# Altium footprint library AI.PcbLib: 137 footprints (part 7 of 9)
Each footprint in its own frame and in the unit in brackets; x right, y up, seen from the top. Pads: shape width x height; smd on the part's side, far side on the other; paste and mask are expansions set on the pad; w line width, h text height; cw(c..) or ccw(c..) is an arc to the next point about the centre after c.
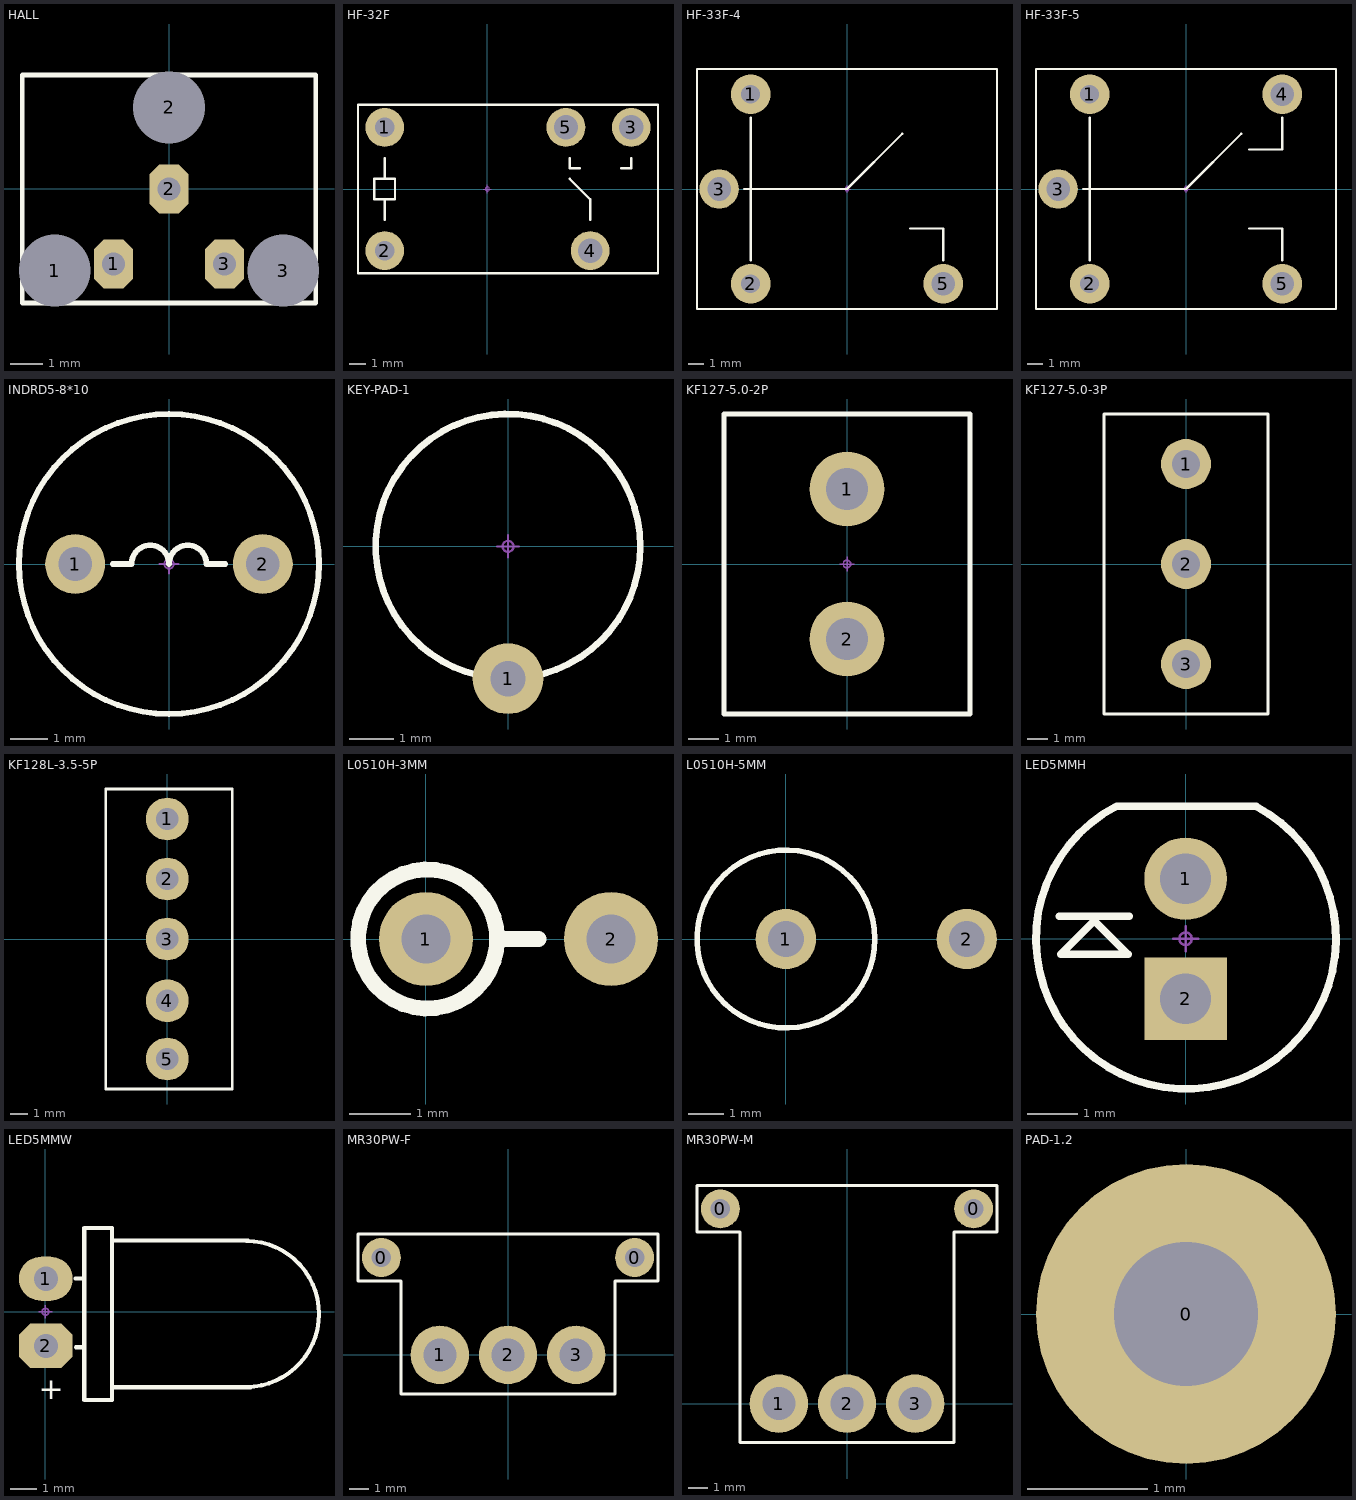
[diagram p6: the footprints below, top view; thin cyan lines are the x and y axes]

## HALL [mm]
pads (6):
  round 2 hole 2.2: 1(-3.5,-2.5) 2(0,2.5) 3(3.5,-2.5)
  oct 1.2x1.5 hole 0.7: 1(-1.7,-2.3) 2(0,0) 3(1.7,-2.3)
Top Overlay:
  lines w0.152: -4.5,-3.5 -4.5,3.5 4.5,3.5 4.5,-3.5 -4.5,-3.5
3D body "huoerjia.stp": height 13, standoff -2.5, extent -4.5,-3.5 4.5,3.5

## HF-32F [mm]
pads (5):
  round 2.4 hole 1.2: 1(-6.35,3.81) 2(-6.35,-3.81)
  round 2.4 hole 1.5: 3(8.89,3.81) 4(6.35,-3.81) 5(4.851,3.81)
Top Overlay:
  lines w0.152: -6.35,-1.905 -6.35,-0.635 ; -6.35,1.905 -6.35,0.635 ; 5.08,0.635 6.35,-0.635 6.35,-1.905 ; 5.08,1.905 5.08,1.27 5.715,1.27 ; 8.255,1.27 8.89,1.27 8.89,1.905 ; -6.35,0.635 -5.715,0.635 -5.715,-0.635 -6.985,-0.635 -6.985,0.635 -6.35,0.635 ; -8.001,-5.207 10.541,-5.207 10.541,5.207 -8.001,5.207 -8.001,-5.207
Mechanical 15:
  circle w0.05: c0,0 r0.125
  lines w0.05: -0.25,0 0.25,0 ; 0,-0.25 0,0.25
3D body "JZC-32F - 副本.stp": height 15.4, standoff -4.4, extent -7.85,-5 10.45,5

## HF-33F-4 [mm]
pads (4):
  round 2.5 hole 1.2: 1(-6.1,6) 2(-6.1,-6)
  round 2.5 hole 1.5: 3(-8.1,0) 5(6.1,-6)
Top Overlay:
  lines w0.152: -6.5,0 0,0 3.5,3.5 ; -6.1,-4.5 -6.1,4.5 ; 4,-2.5 6.1,-2.5 6.1,-4.5 ; -9.5,-7.6 9.5,-7.6 9.5,7.6 -9.5,7.6 -9.5,-7.6
Mechanical 15:
  circle w0.05: c0,0 r0.125
  lines w0.05: -0.25,0 0.25,0 ; 0,-0.25 0,0.25
3D body "User Library-SONGLE Relay SRU-12VDC-SL-C.STEP": height 15.3, standoff -5, extent -9.5,-7.75 9.6,7.75

## HF-33F-5 [mm]
pads (5):
  round 2.5 hole 1.2: 1(-6.1,6) 2(-6.1,-6)
  round 2.5 hole 1.5: 3(-8.1,0) 4(6.1,6) 5(6.1,-6)
Top Overlay:
  lines w0.152: -6.5,0 0,0 3.5,3.5 ; -6.1,-4.5 -6.1,4.5 ; 4,-2.5 6.1,-2.5 6.1,-4.5 ; 4,2.5 6.1,2.5 6.1,4.5 ; -9.5,-7.6 -9.5,7.6 9.5,7.6 9.5,-7.6 -9.5,-7.6
Mechanical 15:
  circle w0.05: c0,0 r0.125
  lines w0.05: -0.25,0 0.25,0 ; 0,-0.25 0,0.25
3D body "User Library-SONGLE Relay SRU-12VDC-SL-C.STEP": height 15.3, standoff -5, extent -9.5,-7.75 9.6,7.75

## INDRD5-8*10 [mm]
pads (2):
  round 1.6 hole 0.9: 1(-2.5,0) 2(2.5,0)
Top Overlay:
  circle w0.152: c0,0 r4
  lines w0.152: -1.5,0 -1,0 cw(c-0.5,0) 0,0 cw(c0.5,0) 1,0 1.5,0
Mechanical 15:
  circle w0.05: c0,0 r0.125
  lines w0.05: -0.25,0 0.25,0 ; 0,-0.25 0,0.25
3D body "Inductor.step": height 11.2, standoff -5, extent -4.15,-4.15 4.15,4.15

## KEY-PAD-1 [mm]
pads (1):
  round 1.6 hole 0.8: 1(0,-3)
Top Overlay:
  circle w0.152: c0,0 r3
Mechanical 15:
  circle w0.05: c0,0 r0.125
  lines w0.05: -0.25,0 0.25,0 ; 0,-0.25 0,0.25
3D body "02.stp": height 11.2, standoff -0.2, extent -5.184,-4.762 4.925,5.066

## KF127-5.0-2P [mm] "ONSHORE"
height 13
pads (2):
  round 2.5 hole 1.4: 1(0,2.5) 2(0,-2.5)
Top Overlay:
  lines w0.152: -4.1,-5 4.1,-5 4.1,5 -4.1,5 -4.1,-5
Mechanical 15:
  circle w0.05: c0,0 r0.125
  lines w0.05: -0.25,0 0.25,0 ; 0,-0.25 0,0.25

## KF127-5.0-3P [mm] "ONSHORE"
height 13
pads (3):
  round 2.5 hole 1.4: 1(0,5) 2(0,0) 3(0,-5)
Top Overlay:
  lines w0.152: -4.1,-7.5 4.1,-7.5 4.1,7.5 -4.1,7.5 -4.1,-7.5
Mechanical 15:
  circle w0.05: c0,0 r0.125
  lines w0.05: -0.25,0 0.25,0 ; 0,-0.25 0,0.25

## KF128L-3.5-5P [mm] "ONSHORE"
height 13
pads (5):
  round 2.5 hole 1.3: 1(0,7) 2(0,3.5) 3(0,0) 4(0,-3.6) 5(0,-7)
Top Overlay:
  lines w0.152: -3.6,-8.75 3.8,-8.75 3.8,8.75 -3.6,8.75 -3.6,-8.75
Mechanical 15:
  circle w0.05: c0,0 r0.125
  lines w0.05: -0.25,0 0.25,0 ; 0,-0.25 0,0.25

## L0510H-3MM [mil]
pads (2):
  round 60 hole 31.5: 1(0,0) 2(118.11,0)
Top Overlay:
  circle w10: c0.98,0 r44.39
  lines w10: 45.37,0 71.85,0
Mechanical 15:
  circle w1.97: c0,0 r4.92
  lines w1.97: -9.84,0 9.84,0 ; 0,-9.84 0,9.84
3D body "v150-080.stp": height 0.79, standoff -64.96, extent -29.52,-29.52 29.53,29.53
3D body "v150-080.stp": height 0.79, standoff -64.96, extent 88.59,-29.52 147.65,29.53
3D body "pr01h.stp": height 407.96, standoff -102.26, extent -31.4,-47.24 141.64,51.18

## L0510H-5MM [mm]
pads (2):
  round 1.7 hole 1: 1(0,0) 2(5.08,0)
Top Overlay:
  circle w0.152: c0,0 r2.5
Mechanical 15:
  circle w0.05: c0,0 r0.125
  circle w0.05: c0,0 r0.125
  lines w0.05: -0.25,0 0.25,0 -0.25,0 ; 0,-0.25 0,0.25 0,-0.25
3D body "RESADV508-1670X520.stp": height 23.6, standoff -3.7, extent -2.6,-2.6 5.47,2.6
3D body "v200-130.stp": height 0.02, standoff -1.65, extent -1,-1 1,1
3D body "v200-130.stp": height 0.02, standoff -1.65, extent 4.08,-1 6.08,1

## LED5MMH [mm]
pads (2):
  oval 1.65x1.651 hole 1.016 mask+0.03: 1(0,1.2)
  rect 1.65x1.651 hole 1.016 mask+0.03: 2(0,-1.2)
Top Overlay:
  lines w0.152: -2.525,0.451 -1.128,0.451 ; -1.4,2.644 ccw(c0.009,-0.005) 1.411,2.647 -1.378,2.647 ; -1.154,-0.311 -1.827,0.362 -2.5,-0.311 -1.15,-0.311
Mechanical 15:
  circle w0.05: c0,0 r0.125
  circle w0.05: c0,0 r0.125
  lines w0.05: -0.25,0 0.25,0 -0.25,0 ; 0,-0.25 0,0.25 0,-0.25
3D body "LED5_RED.STEP": height 8.6, standoff -2, extent -2.845,-2.891 2.852,2.459

## LED5MMW [mm]
pads (2):
  oval 2x1.651 hole 0.9 mask+0.03: 1(0.014,1.23)
  oct 2x1.651 hole 0.9 mask+0.03: 2(0.014,-1.271)
Top Overlay:
  lines w0.152: 1.115,1.245 1.445,1.245 ; 1.141,-1.321 1.395,-1.321 ; 2.487,-2.813 7.643,-2.813 ; 2.563,2.648 7.541,2.648 ; 7.491,2.642 cw(c7.469,-0.08) 7.491,-2.802 ; 1.445,-3.283 2.487,-3.283 2.487,3.117 1.445,3.117 1.445,-3.283
  text "+" at -0.256,-3.251 h0.81
Mechanical 15:
  circle w0.05: c0,0 r0.125
  circle w0.05: c0,0 r0.125
  lines w0.05: -0.25,0 0.25,0 -0.25,0 ; 0,-0.25 0,0.25 0,-0.25
3D body "LED5-H.STEP": height 6, standoff -2.07, extent -0.349,-3.073 11.174,2.927

## MR30PW-F [mm]
pads (5):
  round 2 hole 1: 0(-6.5,5) 0(6.5,5)
  round 3 hole 1.7: 1(-3.5,0) 2(0,0) 3(3.5,0)
Top Overlay:
  lines w0.152: -7.7,3.8 -7.7,6.2 7.7,6.2 7.7,3.8 5.5,3.8 5.5,-2 -5.5,-2 -5.5,3.8 -7.7,3.8

## MR30PW-M [mm]
pads (5):
  round 2 hole 1: 0(-6.5,10) 0(6.5,10)
  round 3 hole 1.7: 1(-3.5,0) 2(0,0) 3(3.5,0)
Top Overlay:
  lines w0.152: -7.7,8.8 -7.7,11.2 7.7,11.2 7.7,8.8 5.5,8.8 5.5,-2 -5.5,-2 -5.5,8.8 -7.7,8.8

## PAD-1.2 [mm]
pads (1):
  round 2.5 hole 1.2: 0(0,0)
Mechanical 15:
  circle w0.05: c0,0 r0.125
  lines w0.05: -0.25,0 0.25,0 ; 0,-0.25 0,0.25